# Altium footprint library Electronic Devices_LIB.PcbLib: 410 footprints (part 12 of 26)
Each footprint in its own frame and in the unit in brackets; x right, y up, seen from the top. Pads: shape width x height; smd on the part's side, far side on the other; paste and mask are expansions set on the pad; w line width, h text height; cw(c..) or ccw(c..) is an arc to the next point about the centre after c.
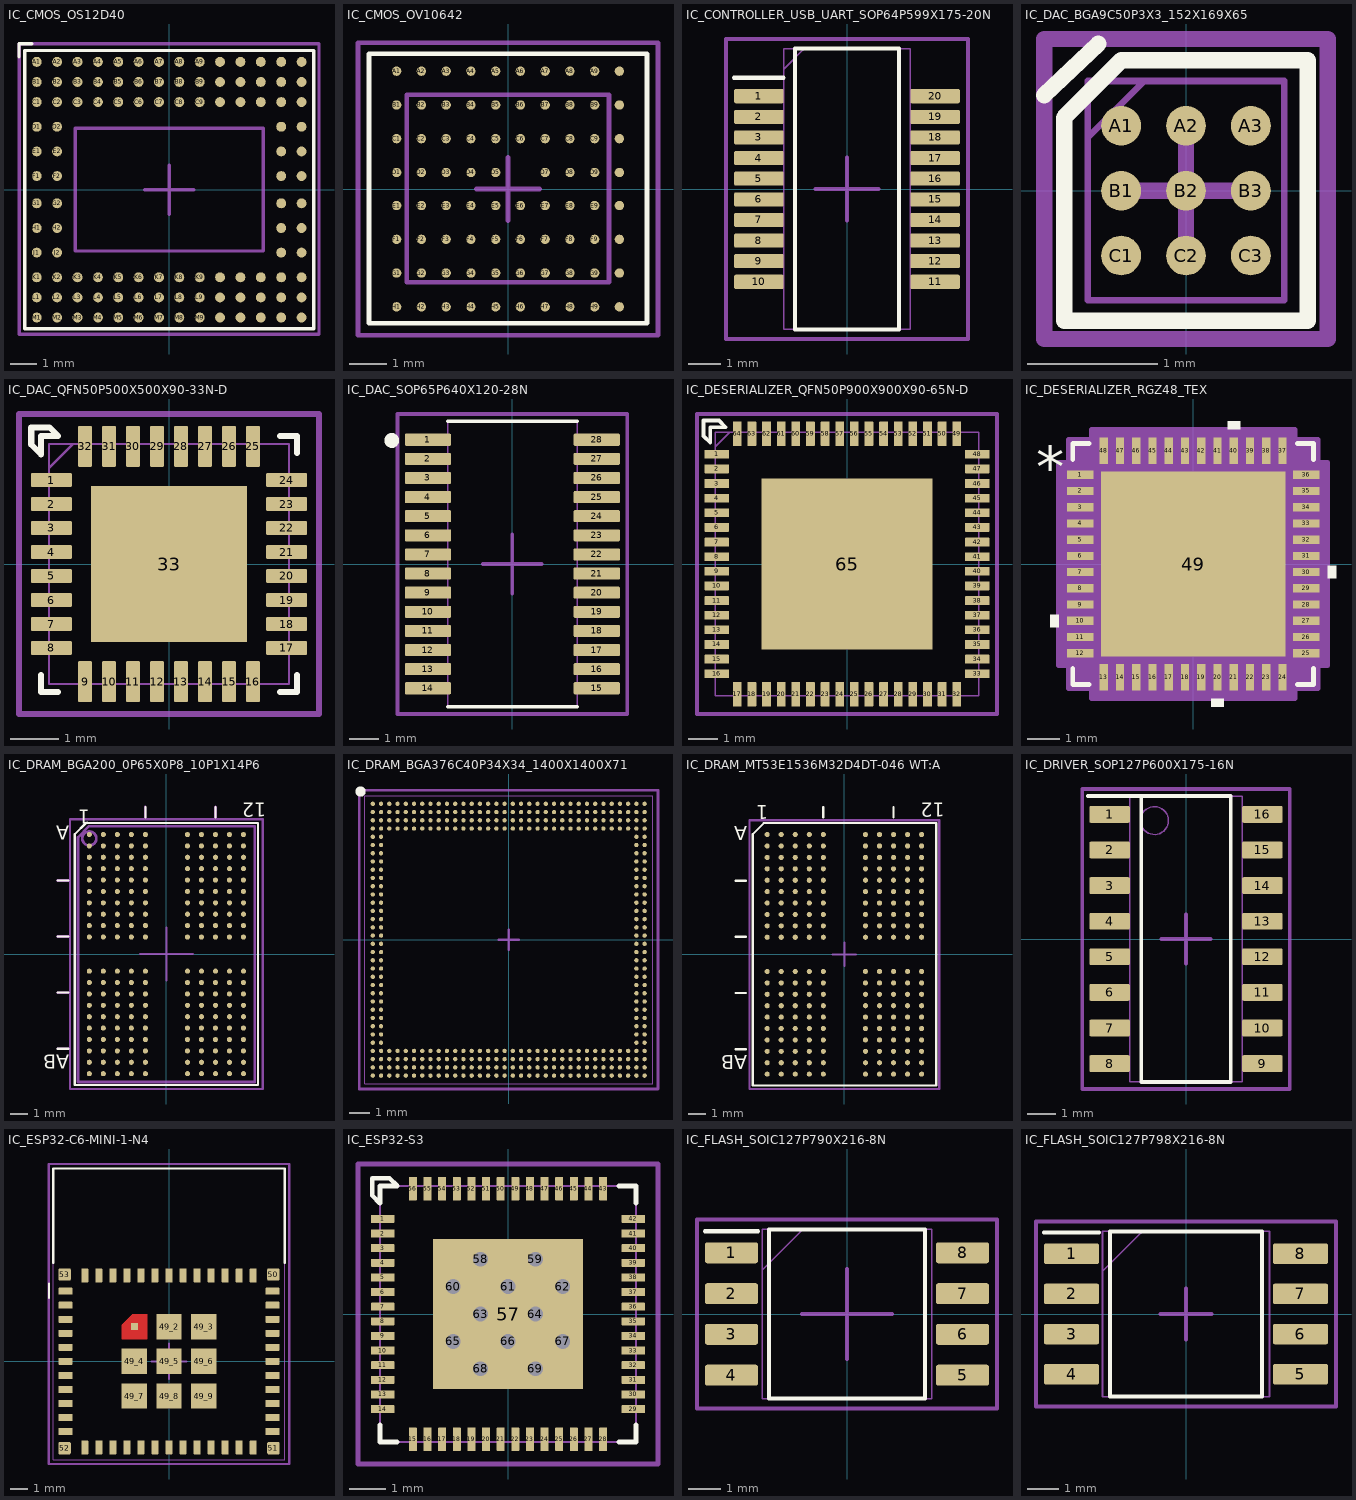
[diagram p11: the footprints below, top view; thin cyan lines are the x and y axes]

## IC_CMOS_OS12D40 [mm] "108-PIN-FANOUT BGA"
height 0.95
pads (112):
  round 0.37 smd: A1(-4.938,4.768) A2(-4.178,4.768) A3(-3.418,4.768) A4(-2.658,4.768) A5(-1.898,4.768) A6(-1.138,4.768) A7(-0.378,4.768) A8(0.378,4.768) A9(1.138,4.768) A10(1.898,4.768) A11(2.658,4.768) A12(3.418,4.768) A13(4.178,4.768) A14(4.938,4.768) B1(-4.938,4.018) B2(-4.178,4.018) B3(-3.418,4.018) B4(-2.658,4.018) B5(-1.898,4.018) B6(-1.138,4.018) B7(-0.378,4.018) B8(0.378,4.018) B9(1.138,4.018) B10(1.898,4.018) B11(2.658,4.018) B12(3.418,4.018) B13(4.178,4.018) B14(4.938,4.018) C1(-4.938,3.268) C2(-4.178,3.268) C3(-3.418,3.268) C4(-2.658,3.268) C5(-1.898,3.268) C6(-1.138,3.268) C7(-0.378,3.268) C8(0.378,3.268) C9(1.138,3.268) C10(1.898,3.268) C11(2.658,3.268) C12(3.418,3.268) C13(4.178,3.268) C14(4.938,3.268) D1(-4.938,2.348) D2(-4.178,2.348) D13(4.178,2.348) D14(4.938,2.348) E1(-4.938,1.428) E2(-4.178,1.428) E13(4.178,1.428) E14(4.938,1.428) F1(-4.938,0.508) F2(-4.178,0.508) F13(4.178,0.508) F14(4.938,0.508) G1(-4.938,-0.508) G2(-4.178,-0.508) G13(4.178,-0.508) G14(4.938,-0.508) H1(-4.938,-1.428) H2(-4.178,-1.428) H13(4.178,-1.428) H14(4.938,-1.428) J1(-4.938,-2.348) J2(-4.178,-2.348) J13(4.178,-2.348) J14(4.938,-2.348) K1(-4.938,-3.268) K2(-4.178,-3.268) K3(-3.418,-3.268) K4(-2.658,-3.268) K5(-1.898,-3.268) K6(-1.138,-3.268) K7(-0.378,-3.268) K8(0.378,-3.268) K9(1.138,-3.268) K10(1.898,-3.268) K11(2.658,-3.268) K12(3.418,-3.268) K13(4.178,-3.268) K14(4.938,-3.268) L1(-4.938,-4.018) L2(-4.178,-4.018) L3(-3.418,-4.018) L4(-2.658,-4.018) L5(-1.898,-4.018) L6(-1.138,-4.018) L7(-0.378,-4.018) L8(0.378,-4.018) L9(1.138,-4.018) L10(1.898,-4.018) L11(2.658,-4.018) L12(3.418,-4.018) L13(4.178,-4.018) L14(4.938,-4.018) M1(-4.938,-4.768) M2(-4.178,-4.768) M3(-3.418,-4.768) M4(-2.658,-4.768) M5(-1.898,-4.768) M6(-1.138,-4.768) M7(-0.378,-4.768) M8(0.378,-4.768) M9(1.138,-4.768) M10(1.898,-4.768) M11(2.658,-4.768) M12(3.418,-4.768) M13(4.178,-4.768) M14(4.938,-4.768) ""(-4.938,-4.768) ""(-4.938,4.768) ""(4.938,-4.768) ""(4.938,4.768)
Top Overlay:
  lines w0.127: -5.601,4.953 -5.601,5.436 -5.118,5.436 ; -5.385,-5.182 5.39,-5.182 5.39,5.19 -5.377,5.19 -5.385,5.182 -5.385,-5.182
Mechanical 1:
  lines w0.127: -3.505,-2.286 3.505,-2.286 3.505,2.286 3.505,2.291 -3.5,2.291 -3.505,2.286 -3.505,-2.286 ; -3.505,-2.286 -3.505,-2.286
Top Assembly:
  text ".Designator" at -2.464,-0.237 h0.51
Top Courtyard:
  lines w0.127: -0.914,0 0,0 ; 0,-0.914 0,0 ; 0,0.914 0,0 ; 0.914,0 0,0 ; -5.588,-5.385 5.588,-5.385 5.588,5.436 -5.588,5.436 -5.588,-5.385

## IC_CMOS_OV10642 [mm]
height 0.67
pads (79):
  round 0.25 smd: A1(-2.97,3.141) A2(-2.31,3.141) A3(-1.65,3.141) A4(-0.99,3.141) A5(-0.33,3.141) A6(0.33,3.141) A7(0.99,3.141) A8(1.65,3.141) A9(2.31,3.141) A10(2.97,3.141) B1(-2.97,2.241) B2(-2.31,2.241) B3(-1.65,2.241) B4(-0.99,2.241) B5(-0.33,2.241) B6(0.33,2.241) B7(0.99,2.241) B8(1.65,2.241) B9(2.31,2.241) B10(2.97,2.241) C1(-2.97,1.341) C2(-2.31,1.341) C3(-1.65,1.341) C4(-0.99,1.341) C5(-0.33,1.341) C6(0.33,1.341) C7(0.99,1.341) C8(1.65,1.341) C9(2.31,1.341) C10(2.97,1.341) D1(-2.97,0.441) D2(-2.31,0.441) D3(-1.65,0.441) D4(-0.99,0.441) D5(-0.33,0.441) D7(0.99,0.441) D8(1.65,0.441) D9(2.31,0.441) D10(2.97,0.441) E1(-2.97,-0.441) E2(-2.31,-0.441) E3(-1.65,-0.441) E4(-0.99,-0.441) E5(-0.33,-0.441) E6(0.33,-0.441) E7(0.99,-0.441) E8(1.65,-0.441) E9(2.31,-0.441) E10(2.97,-0.441) F1(-2.97,-1.341) F2(-2.31,-1.341) F3(-1.65,-1.341) F4(-0.99,-1.341) F5(-0.33,-1.341) F6(0.33,-1.341) F7(0.99,-1.341) F8(1.65,-1.341) F9(2.31,-1.341) F10(2.97,-1.341) G1(-2.97,-2.241) G2(-2.31,-2.241) G3(-1.65,-2.241) G4(-0.99,-2.241) G5(-0.33,-2.241) G6(0.33,-2.241) G7(0.99,-2.241) G8(1.65,-2.241) G9(2.31,-2.241) G10(2.97,-2.241) H1(-2.97,-3.141) H2(-2.31,-3.141) H3(-1.65,-3.141) H4(-0.99,-3.141) H5(-0.33,-3.141) H6(0.33,-3.141) H7(0.99,-3.141) H8(1.65,-3.141) H9(2.31,-3.141) H10(2.97,-3.141)
Top Overlay:
  lines w0.127: -3.71,3.581 -3.71,3.583 -3.71,-3.581 3.708,-3.581 3.708,3.581 ; -3.71,3.607 -3.023,3.607 3.708,3.607
Mechanical 1:
  lines w0.127: -2.7,-2.481 -2.692,-2.489 2.692,-2.489 2.692,2.515 -2.7,2.515 -2.7,-2.481
Top Assembly:
  text ".Designator" at -2.54,-0.263 h0.51
Top Courtyard:
  lines w0.127: -0.838,0 0,0 ; 0,-0.838 0,0 ; 0,0.838 0,0 ; 0,0 0.838,0 0,0 ; -4,-3.9 -4,3.9 4,3.9 4,-3.9 -4,-3.9

## IC_CONTROLLER_USB_UART_SOP64P599X175-20N [mm] "20-SSOP (0.154\", 3.90mm Width)"
height 1.7
pads (20):
  rrect20% 1.526x0.435 smd: 1(-2.712,2.858) 2(-2.712,2.222) 3(-2.712,1.588) 4(-2.712,0.952) 5(-2.712,0.318) 6(-2.712,-0.318) 7(-2.712,-0.952) 8(-2.712,-1.588) 9(-2.712,-2.222) 10(-2.712,-2.858) 11(2.712,-2.858) 12(2.712,-2.222) 13(2.712,-1.588) 14(2.712,-0.952) 15(2.712,-0.318) 16(2.712,0.318) 17(2.712,0.952) 18(2.712,1.588) 19(2.712,2.222) 20(2.712,2.858)
Top Overlay:
  lines w0.127: -3.475,3.425 -1.95,3.425 ; -1.6,-4.324 1.6,-4.324 1.6,4.324 -1.6,4.324 -1.6,-4.324
Top Assembly:
  text ".Designator" at -2.616,-0.161 h0.51
Top Courtyard:
  lines w0.127: -0.965,0 0,0 ; 0,-0.965 0,0 ; 0,0.965 0,0 ; 0.965,0 0,0 ; -3.725,-4.619 3.725,-4.619 3.725,4.619 -3.725,4.619 -3.725,-4.619
Top Component Center:
  lines w0.051: -1.95,3.69 -1.314,4.324 ; -1.95,-4.324 1.95,-4.324 1.95,4.324 -1.95,4.324 -1.95,-4.324
3D body "FT231XS-R.stp": height 1.75, standoff 0, extent -2.997,-4.324 2.997,4.324

## IC_DAC_BGA9C50P3X3_152X169X65 [mm]
pads (9):
  round 0.306 smd: A1(-0.5,0.5) A2(0,0.5) A3(0.5,0.5) B1(-0.5,0) B2(0,0) B3(0.5,0) C1(-0.5,-0.5) C2(0,-0.5) C3(0.5,-0.5)
Top Overlay:
  lines w0.127: -1.092,0.737 -0.678,1.13 ; -0.94,-1.003 -0.94,0.563 -0.5,1.003 0.94,1.003 0.94,-1.003 -0.94,-1.003
Top Assembly:
  lines w0.051: -0.758,0.408 -0.32,0.846 ; -0.758,-0.845 -0.758,0.845 0.757,0.845 0.757,-0.845 -0.758,-0.845
  text ".Designator" at -2.54,-0.263 h0.51
Top Courtyard:
  lines w0.127: -0.432,0 0,0 ; 0,-0.432 0,0 ; 0,0.432 0,0 ; 0.432,0 0,0 ; -1.092,-1.143 -1.092,1.168 1.092,1.168 1.092,-1.143 -1.092,-1.143
3D body "AD5821ABCBZ-REEL7.stp": height 0.65, standoff 0, extent -0.757,-0.845 0.757,0.845

## IC_DAC_QFN50P500X500X90-33N-D [mm] "32 QFN"
height 0.8
pads (33):
  rrect20% 0.85x0.3 smd: 1(-2.45,1.75) 2(-2.45,1.25) 3(-2.45,0.75) 4(-2.45,0.25) 5(-2.45,-0.25) 6(-2.45,-0.75) 7(-2.45,-1.25) 8(-2.45,-1.75) 17(2.45,-1.75) 18(2.45,-1.25) 19(2.45,-0.75) 20(2.45,-0.25) 21(2.45,0.25) 22(2.45,0.75) 23(2.45,1.25) 24(2.45,1.75)
  rrect20% 0.3x0.85 smd: 9(-1.75,-2.45) 10(-1.25,-2.45) 11(-0.75,-2.45) 12(-0.25,-2.45) 13(0.25,-2.45) 14(0.75,-2.45) 15(1.25,-2.45) 16(1.75,-2.45) 25(1.75,2.45) 26(1.25,2.45) 27(0.75,2.45) 28(0.25,2.45) 29(-0.25,2.45) 30(-0.75,2.45) 31(-1.25,2.45) 32(-1.75,2.45)
  rect 3.25x3.25 smd: 33(0,0)
Top Overlay:
  lines w0.127: -2.667,-2.311 -2.667,-2.667 -2.311,-2.667 ; 2.311,-2.667 2.667,-2.667 2.667,-2.311 ; 2.311,2.667 2.667,2.667 2.667,2.311 ; -2.87,2.489 -2.667,2.286 -2.667,2.667 -2.311,2.667 -2.489,2.845 -2.515,2.845 -2.87,2.845 -2.87,2.489
Top Assembly:
  lines w0.051: -2.5,2 -2,2.5 ; -2.5,-2.5 2.5,-2.5 2.5,2.5 -2.5,2.5 -2.5,-2.5
  text ".Designator" at -2.489,-0.085 h0.51
Top Courtyard:
  lines w0.127: -0.635,0 0,0 ; 0,-0.635 0,0 ; 0,0.635 0,0 ; 0.635,0 0,0 ; -3.125,-3.125 3.125,-3.125 3.125,3.125 -3.125,3.125 -3.125,-3.125
3D body "ES9039Q2M.stp": height 0.9, standoff 0, extent -2.55,-2.55 2.55,2.55

## IC_DAC_SOP65P640X120-28N [mm]
pads (28):
  rrect20% 1.57x0.41 smd: 1(-2.87,4.225) 2(-2.87,3.575) 3(-2.87,2.925) 4(-2.87,2.275) 5(-2.87,1.625) 6(-2.87,0.975) 7(-2.87,0.325) 8(-2.87,-0.325) 9(-2.87,-0.975) 10(-2.87,-1.625) 11(-2.87,-2.275) 12(-2.87,-2.925) 13(-2.87,-3.575) 14(-2.87,-4.225) 15(2.87,-4.225) 16(2.87,-3.575) 17(2.87,-2.925) 18(2.87,-2.275) 19(2.87,-1.625) 20(2.87,-0.975) 21(2.87,-0.325) 22(2.87,0.325) 23(2.87,0.975) 24(2.87,1.625) 25(2.87,2.275) 26(2.87,2.925) 27(2.87,3.575) 28(2.87,4.225)
Top Overlay:
  circle w0.3: c-4.1,4.2 r0.1
  lines w0.127: -2.2,-4.85 2.2,-4.85 ; -2.2,4.85 2.2,4.85
Top Assembly:
  lines w0.051: -2.2,-4.85 -2.2,4.85 2.2,4.85 2.2,-4.85 -2.2,-4.85
  text ".Designator" at -2.549,-0.28 h0.51
Top Courtyard:
  lines w0.127: -1,0 0,0 ; 0,-1 0,0 ; 0,1 0,0 ; 1,0 0,0 ; -3.905,-5.1 3.905,-5.1 3.905,5.1 -3.905,5.1 -3.905,-5.1
3D body "step_temp.STEP": height 1.2, standoff 0, extent -3.2,-4.85 3.2,4.85

## IC_DESERIALIZER_QFN50P900X900X90-65N-D [mm]
pads (65):
  rrect20% 0.85x0.3 smd: 1(-4.45,3.75) 2(-4.45,3.25) 3(-4.45,2.75) 4(-4.45,2.25) 5(-4.45,1.75) 6(-4.45,1.25) 7(-4.45,0.75) 8(-4.45,0.25) 9(-4.45,-0.25) 10(-4.45,-0.75) 11(-4.45,-1.25) 12(-4.45,-1.75) 13(-4.45,-2.25) 14(-4.45,-2.75) 15(-4.45,-3.25) 16(-4.45,-3.75) 33(4.45,-3.75) 34(4.45,-3.25) 35(4.45,-2.75) 36(4.45,-2.25) 37(4.45,-1.75) 38(4.45,-1.25) 39(4.45,-0.75) 40(4.45,-0.25) 41(4.45,0.25) 42(4.45,0.75) 43(4.45,1.25) 44(4.45,1.75) 45(4.45,2.25) 46(4.45,2.75) 47(4.45,3.25) 48(4.45,3.75)
  rrect20% 0.3x0.85 smd: 17(-3.75,-4.45) 18(-3.25,-4.45) 19(-2.75,-4.45) 20(-2.25,-4.45) 21(-1.75,-4.45) 22(-1.25,-4.45) 23(-0.75,-4.45) 24(-0.25,-4.45) 25(0.25,-4.45) 26(0.75,-4.45) 27(1.25,-4.45) 28(1.75,-4.45) 29(2.25,-4.45) 30(2.75,-4.45) 31(3.25,-4.45) 32(3.75,-4.45) 49(3.75,4.45) 50(3.25,4.45) 51(2.75,4.45) 52(2.25,4.45) 53(1.75,4.45) 54(1.25,4.45) 55(0.75,4.45) 56(0.25,4.45) 57(-0.25,4.45) 58(-0.75,4.45) 59(-1.25,4.45) 60(-1.75,4.45) 61(-2.25,4.45) 62(-2.75,4.45) 63(-3.25,4.45) 64(-3.75,4.45)
  rect 5.85x5.85 smd: 65(0,0)
Top Overlay:
  lines w0.127: -4.902,4.369 -4.674,4.14 -4.674,4.674 -4.14,4.674 -4.369,4.902 -4.902,4.902 -4.902,4.369
Top Assembly:
  lines w0.051: -4.5,4 -4,4.5 ; -4.5,-4.5 4.5,-4.5 4.5,4.5 -4.5,4.5 -4.5,-4.5
Top Courtyard:
  lines w0.127: -5.125,-5.125 5.125,-5.125 5.125,5.125 -5.125,5.125 -5.125,-5.125
3D body "DS90UB960WRTDRQ1.stp": height 0.85, standoff 0, extent -4.5,-4.5 4.5,4.5

## IC_DESERIALIZER_RGZ48_TEX [mil]
pads (49):
  rect 32x10 smd paste+0 mask+0: 1(-137,108.27) 2(-137,88.58) 3(-137,68.9) 4(-137,49.21) 5(-137,29.53) 6(-137,9.84) 7(-137,-9.84) 8(-137,-29.53) 9(-137,-49.21) 10(-137,-68.9) 11(-137,-88.58) 12(-137,-108.27) 25(137,-108.27) 26(137,-88.58) 27(137,-68.9) 28(137,-49.21) 29(137,-29.53) 30(137,-9.84) 31(137,9.84) 32(137,29.53) 33(137,49.21) 34(137,68.9) 35(137,88.58) 36(137,108.27)
  rect 10x32 smd paste+0 mask+0: 13(-108.27,-137) 14(-88.58,-137) 15(-68.9,-137) 16(-49.21,-137) 17(-29.53,-137) 18(-9.84,-137) 19(9.84,-137) 20(29.53,-137) 21(49.21,-137) 22(68.9,-137) 23(88.58,-137) 24(108.27,-137) 37(108.27,137) 38(88.58,137) 39(68.9,137) 40(49.21,137) 41(29.53,137) 42(9.84,137) 43(-9.84,137) 44(-29.53,137) 45(-49.21,137) 46(-68.9,137) 47(-88.58,137) 48(-108.27,137)
  rect 224x224 smd paste-111.5 mask-111.5: 49(0,0)
Top Overlay:
  region: 56.71,163 41.71,163 41.71,173 56.71,173
  region: 163,-2.34 173,-2.34 173,-17.34 163,-17.34
  region: 37.03,-163 22.03,-163 22.03,-173 37.03,-173
  region: -163,-61.4 -173,-61.4 -173,-76.4 -163,-76.4
  lines w6: -146,-126.37 -146,-146 -126.37,-146 ; -146,126.37 -146,146 -126.37,146 ; 126.37,-146 146,-146 146,-126.37 ; 126.37,146 146,146 146,126.37
  text "*" at -190.5,93.11 h50
Top Paste:
  drawing of 64 lines, arcs and shapes, not listed
Top Solder:
  region: 100.87,-114.5 100.87,114.5 114.5,114.5 114.5,-114.5
  region: 85.13,-114.5 85.13,114.5 69.87,114.5 69.87,-114.5
  region: 54.13,-114.5 54.13,114.5 38.87,114.5 38.87,-114.5
  region: 23.13,-114.5 23.13,114.5 7.87,114.5 7.87,-114.5
  region: -7.87,-114.5 -7.87,114.5 -23.13,114.5 -23.13,-114.5
  region: -38.87,-114.5 -38.87,114.5 -54.13,114.5 -54.13,-114.5
  region: -69.87,-114.5 -69.87,114.5 -85.13,114.5 -85.13,-114.5
  region: -114.5,-114.5 -114.5,114.5 -100.87,114.5 -100.87,-114.5
  region: -114.5,-114.5 -114.5,-100.87 114.5,-100.87 114.5,-114.5
  region: -114.5,-85.13 -114.5,-69.87 114.5,-69.87 114.5,-85.13
  region: -114.5,-54.13 -114.5,-38.87 114.5,-38.87 114.5,-54.13
  region: -114.5,-23.13 -114.5,-7.87 114.5,-7.87 114.5,-23.13
  region: -114.5,7.87 -114.5,23.13 114.5,23.13 114.5,7.87
  region: -114.5,38.87 -114.5,54.13 114.5,54.13 114.5,38.87
  region: -114.5,69.87 -114.5,85.13 114.5,85.13 114.5,69.87
  region: -114.5,100.87 -114.5,114.5 114.5,114.5 114.5,100.87
Top 3D Body:
  lines w1: -141,91 -91,141 ; -141,-141 -141,141 141,141 141,-141 -141,-141 ; -141,-114.27 -141,-102.27 -141,-114.27 ; -141,-94.58 -141,-82.58 -141,-94.58 ; -141,-74.9 -141,-62.9 -141,-74.9 ; -141,-55.21 -141,-43.21 -141,-55.21 ; -141,-35.53 -141,-23.53 -141,-35.53 ; -141,-15.84 -141,-3.84 -141,-15.84 ; -141,3.84 -141,15.84 -141,3.84 ; -141,23.53 -141,35.53 -141,23.53 ; -141,43.21 -141,55.21 -141,43.21 ; -141,62.9 -141,74.9 -141,62.9 ; -141,82.58 -141,94.58 -141,82.58 ; -141,102.27 -141,114.27 -141,102.27 ; -114.27,-141 -102.27,-141 -114.27,-141 ; -114.27,141 -102.27,141 -114.27,141 ; -94.58,-141 -82.58,-141 -94.58,-141 ; -94.58,141 -82.58,141 -94.58,141 ; -74.9,-141 -62.9,-141 -74.9,-141 ; -74.9,141 -62.9,141 -74.9,141 ; -55.21,-141 -43.21,-141 -55.21,-141 ; -55.21,141 -43.21,141 -55.21,141 ; -35.53,-141 -23.53,-141 -35.53,-141 ; -35.53,141 -23.53,141 -35.53,141 ; -15.84,-141 -3.84,-141 -15.84,-141 ; -15.84,141 -3.84,141 -15.84,141 ; 3.84,-141 15.84,-141 3.84,-141 ; 3.84,141 15.84,141 3.84,141 ; 23.53,-141 35.53,-141 23.53,-141 ; 23.53,141 35.53,141 23.53,141 ; 43.21,-141 55.21,-141 43.21,-141 ; 43.21,141 55.21,141 43.21,141 ; 62.9,-141 74.9,-141 62.9,-141 ; 62.9,141 74.9,141 62.9,141 ; 82.58,-141 94.58,-141 82.58,-141 ; 82.58,141 94.58,141 82.58,141 ; 102.27,-141 114.27,-141 102.27,-141 ; 102.27,141 114.27,141 102.27,141 ; 141,-114.27 141,-102.27 141,-114.27 ; 141,-94.58 141,-82.58 141,-94.58 ; 141,-74.9 141,-62.9 141,-74.9 ; 141,-55.21 141,-43.21 141,-55.21 ; 141,-35.53 141,-23.53 141,-35.53 ; 141,-15.84 141,-3.84 141,-15.84 ; 141,3.84 141,15.84 141,3.84 ; 141,23.53 141,35.53 141,23.53 ; 141,43.21 141,55.21 141,43.21 ; 141,62.9 141,74.9 141,62.9 ; 141,82.58 141,94.58 141,82.58 ; 141,102.27 141,114.27 141,102.27
  text "*" at -133.5,93.11 h50
Mechanical 15:
  region: -123.27,-151 -151,-151 -151,-123.27 -163,-123.27 -163,123.27 -151,123.27 -151,151 -123.27,151 -123.27,163 123.27,163 123.27,151 151,151 151,123.27 163,123.27 163,-123.27 151,-123.27 151,-151 123.27,-151 123.27,-163 -123.27,-163
  lines w6: -163,-123.27 -163,123.27 -151,123.27 -151,151 -123.27,151 -123.27,163 123.27,163 123.27,151 151,151 151,123.27 163,123.27 163,-123.27 151,-123.27 151,-151 123.27,-151 123.27,-163 -123.27,-163 -123.27,-151 -151,-151 -151,-123.27 -163,-123.27
3D body "RGZ48_TEX.step": height 39.09, standoff 0, extent -140.98,-140.98 140.98,140.98

## IC_DRAM_BGA200_0P65X0P8_10P1X14P6 [mil] "200-TFBGA (10x14.5)"
height 37.4
pads (200):
  round 11.5 smd: A1(-173.23,268.7) A2(-141.73,268.7) A3(-110.24,268.7) A4(-78.74,268.7) A5(-47.24,268.7) A8(47.24,268.7) A9(78.74,268.7) A10(110.24,268.7) A11(141.73,268.7) A12(173.23,268.7) AA1(-173.23,-243.11) AA2(-141.73,-243.11) AA3(-110.24,-243.11) AA4(-78.74,-243.11) AA5(-47.24,-243.11) AA8(47.24,-243.11) AA9(78.74,-243.11) AA10(110.24,-243.11) AA11(141.73,-243.11) AA12(173.23,-243.11) AB1(-173.23,-268.7) AB2(-141.73,-268.7) AB3(-110.24,-268.7) AB4(-78.74,-268.7) AB5(-47.24,-268.7) AB8(47.24,-268.7) AB9(78.74,-268.7) AB10(110.24,-268.7) AB11(141.73,-268.7) AB12(173.23,-268.7) B1(-173.23,243.11) B2(-141.73,243.11) B3(-110.24,243.11) B4(-78.74,243.11) B5(-47.24,243.11) B8(47.24,243.11) B9(78.74,243.11) B10(110.24,243.11) B11(141.73,243.11) B12(173.23,243.11) C1(-173.23,217.52) C2(-141.73,217.52) C3(-110.24,217.52) C4(-78.74,217.52) C5(-47.24,217.52) C8(47.24,217.52) C9(78.74,217.52) C10(110.24,217.52) C11(141.73,217.52) C12(173.23,217.52) D1(-173.23,191.93) D2(-141.73,191.93) D3(-110.24,191.93) D4(-78.74,191.93) D5(-47.24,191.93) D8(47.24,191.93) D9(78.74,191.93) D10(110.24,191.93) D11(141.73,191.93) D12(173.23,191.93) E1(-173.23,166.34) E2(-141.73,166.34) E3(-110.24,166.34) E4(-78.74,166.34) E5(-47.24,166.34) E8(47.24,166.34) E9(78.74,166.34) E10(110.24,166.34) E11(141.73,166.34) E12(173.23,166.34) F1(-173.23,140.75) F2(-141.73,140.75) F3(-110.24,140.75) F4(-78.74,140.75) F5(-47.24,140.75) F8(47.24,140.75) F9(78.74,140.75) F10(110.24,140.75) F11(141.73,140.75) F12(173.23,140.75) G1(-173.23,115.16) G2(-141.73,115.16) G3(-110.24,115.16) G4(-78.74,115.16) G5(-47.24,115.16) G8(47.24,115.16) G9(78.74,115.16) G10(110.24,115.16) G11(141.73,115.16) G12(173.23,115.16) H1(-173.23,89.57) H2(-141.73,89.57) H3(-110.24,89.57) H4(-78.74,89.57) H5(-47.24,89.57) H8(47.24,89.57) H9(78.74,89.57) H10(110.24,89.57) H11(141.73,89.57) H12(173.23,89.57) J1(-173.23,63.98) J2(-141.73,63.98) J3(-110.24,63.98) J4(-78.74,63.98) J5(-47.24,63.98) J8(47.24,63.98) J9(78.74,63.98) J10(110.24,63.98) J11(141.73,63.98) J12(173.23,63.98) K1(-173.23,38.39) K2(-141.73,38.39) K3(-110.24,38.39) K4(-78.74,38.39) K5(-47.24,38.39) K8(47.24,38.39) K9(78.74,38.39) K10(110.24,38.39) K11(141.73,38.39) K12(173.23,38.39) N1(-173.23,-38.39) N2(-141.73,-38.39) N3(-110.24,-38.39) N4(-78.74,-38.39) N5(-47.24,-38.39) N8(47.24,-38.39) N9(78.74,-38.39) N10(110.24,-38.39) N11(141.73,-38.39) N12(173.23,-38.39) P1(-173.23,-63.98) P2(-141.73,-63.98) P3(-110.24,-63.98) P4(-78.74,-63.98) P5(-47.24,-63.98) P8(47.24,-63.98) P9(78.74,-63.98) P10(110.24,-63.98) P11(141.73,-63.98) P12(173.23,-63.98) R1(-173.23,-89.57) R2(-141.73,-89.57) R3(-110.24,-89.57) R4(-78.74,-89.57) R5(-47.24,-89.57) R8(47.24,-89.57) R9(78.74,-89.57) R10(110.24,-89.57) R11(141.73,-89.57) R12(173.23,-89.57) T1(-173.23,-115.16) T2(-141.73,-115.16) T3(-110.24,-115.16) T4(-78.74,-115.16) T5(-47.24,-115.16) T8(47.24,-115.16) T9(78.74,-115.16) T10(110.24,-115.16) T11(141.73,-115.16) T12(173.23,-115.16) U1(-173.23,-140.75) U2(-141.73,-140.75) U3(-110.24,-140.75) U4(-78.74,-140.75) U5(-47.24,-140.75) U8(47.24,-140.75) U9(78.74,-140.75) U10(110.24,-140.75) U11(141.73,-140.75) U12(173.23,-140.75) V1(-173.23,-166.34) V2(-141.73,-166.34) V3(-110.24,-166.34) V4(-78.74,-166.34) V5(-47.24,-166.34) V8(47.24,-166.34) V9(78.74,-166.34) V10(110.24,-166.34) V11(141.73,-166.34) V12(173.23,-166.34) W1(-173.23,-191.93) W2(-141.73,-191.93) W3(-110.24,-191.93) W4(-78.74,-191.93) W5(-47.24,-191.93) W8(47.24,-191.93) W9(78.74,-191.93) W10(110.24,-191.93) W11(141.73,-191.93) W12(173.23,-191.93) Y1(-173.23,-217.52) Y2(-141.73,-217.52) Y3(-110.24,-217.52) Y4(-78.74,-217.52) Y5(-47.24,-217.52) Y8(47.24,-217.52) Y9(78.74,-217.52) Y10(110.24,-217.52) Y11(141.73,-217.52) Y12(173.23,-217.52)
Top Overlay:
  lines w5: -244.09,-212.6 -220.47,-212.6 ; -244.09,-86.61 -220.47,-86.61 ; -244.09,39.37 -220.47,39.37 ; -244.09,165.35 -220.47,165.35 ; -47.24,307.09 -47.24,330.71 ; 110.24,307.09 110.24,330.71 ; -205.82,-294.4 -205.82,269.4 -180.82,294.4 205.82,294.4 205.82,-294.4 -205.82,-294.4
  text "12" at 224.76,339.97 h31
  text "1" at -170.96,324.55 h31
  text "A" at -218.24,287.97 h31
  text "AB" at -218.24,-226.03 h31
Top Assembly:
  circle w6: c-173.23,259.84 r15.75
  lines w6: -244.09,-212.6 -220.47,-212.6 ; -244.09,-86.61 -220.47,-86.61 ; -244.09,39.37 -220.47,39.37 ; -244.09,165.35 -220.47,165.35 ; -47.24,307.09 -47.24,330.71 ; 110.24,307.09 110.24,330.71 ; -198.82,-287.4 -198.82,262.4 -173.82,287.4 198.82,287.4 198.82,-287.4 -198.82,-287.4
  text ".Designator" at -88.55,-11.02 h20
  text "AB" at -214.73,-279.27 h20
  text "A" at -236.22,259.84 h20
  text "12" at 173.23,307.09 h20
  text "1" at -173.23,307.09 h20
Top Courtyard:
  lines w5: -59.06,0 0,0 ; 0,-59.06 0,0 ; 0,59.06 0,0 ; 59.06,0 0,0 ; -216.54,-303.15 -216.54,303.15 216.54,303.15 216.54,-303.15 -216.54,-303.15
Top Component Center:
  lines w1: -10,0 10,0 ; 0,-10 0,10
3D body "VFBGA200_10X145_DT_MRN.step": height 37.09, standoff -0.01, extent -199.02,-292.48 199.02,282.48

## IC_DRAM_BGA376C40P34X34_1400X1400X71 [mm] "BGA, 376-Leads, Body 14.00x14.00mmx0.71mm, Pitch 0.40mm"
height 0.71
pads (376):
  round 0.21 smd: A2(-6.2,6.6) A3(-5.8,6.6) A4(-5.4,6.6) A5(-5,6.6) A6(-4.6,6.6) A7(-4.2,6.6) A10(-3,6.6) A11(-2.6,6.6) A12(-2.2,6.6) A13(-1.8,6.6) A14(-1.4,6.6) A15(-1,6.6) A16(-0.6,6.6) A19(0.6,6.6) A20(1,6.6) A21(1.4,6.6) A22(1.8,6.6) A23(2.2,6.6) A24(2.6,6.6) A25(3,6.6) A26(3.4,6.6) A29(4.6,6.6) A30(5,6.6) A31(5.4,6.6) A32(5.8,6.6) A33(6.2,6.6) AH1(-6.6,-4.2) AH2(-6.2,-4.2) AH33(6.2,-4.2) AH34(6.6,-4.2) AJ1(-6.6,-4.6) AJ2(-6.2,-4.6) AJ33(6.2,-4.6) AJ34(6.6,-4.6) AK1(-6.6,-5) AK2(-6.2,-5) AK33(6.2,-5) AK34(6.6,-5) AL1(-6.6,-5.4) AL2(-6.2,-5.4) AL3(-5.8,-5.4) AL4(-5.4,-5.4) AL5(-5,-5.4) AL6(-4.6,-5.4) AL7(-4.2,-5.4) AL8(-3.8,-5.4) AL9(-3.4,-5.4) AL10(-3,-5.4) AL11(-2.6,-5.4) AL12(-2.2,-5.4) AL13(-1.8,-5.4) AL14(-1.4,-5.4) AL15(-1,-5.4) AL16(-0.6,-5.4) AL17(-0.2,-5.4) AL18(0.2,-5.4) AL19(0.6,-5.4) AL20(1,-5.4) AL21(1.4,-5.4) AL22(1.8,-5.4) AL23(2.2,-5.4) AL24(2.6,-5.4) AL25(3,-5.4) AL26(3.4,-5.4) AL27(3.8,-5.4) AL28(4.2,-5.4) AL29(4.6,-5.4) AL30(5,-5.4) AL31(5.4,-5.4) AL32(5.8,-5.4) AL33(6.2,-5.4) AL34(6.6,-5.4) AM1(-6.6,-5.8) AM2(-6.2,-5.8) AM3(-5.8,-5.8) AM4(-5.4,-5.8) AM5(-5,-5.8) AM6(-4.6,-5.8) AM7(-4.2,-5.8) AM8(-3.8,-5.8) AM9(-3.4,-5.8) AM10(-3,-5.8) AM11(-2.6,-5.8) AM12(-2.2,-5.8) AM13(-1.8,-5.8) AM14(-1.4,-5.8) AM15(-1,-5.8) AM16(-0.6,-5.8) AM17(-0.2,-5.8) AM18(0.2,-5.8) AM19(0.6,-5.8) AM20(1,-5.8) AM21(1.4,-5.8) AM22(1.8,-5.8) AM23(2.2,-5.8) AM24(2.6,-5.8) AM25(3,-5.8) AM26(3.4,-5.8) AM27(3.8,-5.8) AM28(4.2,-5.8) AM29(4.6,-5.8) AM30(5,-5.8) AM31(5.4,-5.8) AM32(5.8,-5.8) AM33(6.2,-5.8) AM34(6.6,-5.8) AN1(-6.6,-6.2) AN2(-6.2,-6.2) AN3(-5.8,-6.2) AN4(-5.4,-6.2) AN5(-5,-6.2) AN6(-4.6,-6.2) AN7(-4.2,-6.2) AN8(-3.8,-6.2) AN9(-3.4,-6.2) AN10(-3,-6.2) AN11(-2.6,-6.2) AN12(-2.2,-6.2) AN13(-1.8,-6.2) AN14(-1.4,-6.2) AN15(-1,-6.2) AN16(-0.6,-6.2) AN19(0.6,-6.2) AN20(1,-6.2) AN21(1.4,-6.2) AN22(1.8,-6.2) AN23(2.2,-6.2) AN24(2.6,-6.2) AN25(3,-6.2) AN26(3.4,-6.2) AN27(3.8,-6.2) AN28(4.2,-6.2) AN29(4.6,-6.2) AN30(5,-6.2) AN31(5.4,-6.2) AN32(5.8,-6.2) AN33(6.2,-6.2) AN34(6.6,-6.2) AP2(-6.2,-6.6) AP3(-5.8,-6.6) AP4(-5.4,-6.6) AP5(-5,-6.6) AP6(-4.6,-6.6) AP7(-4.2,-6.6) AP10(-3,-6.6) AP11(-2.6,-6.6) AP12(-2.2,-6.6) AP13(-1.8,-6.6) AP14(-1.4,-6.6) AP15(-1,-6.6) AP16(-0.6,-6.6) AP19(0.6,-6.6) AP20(1,-6.6) AP21(1.4,-6.6) AP22(1.8,-6.6) AP23(2.2,-6.6) AP24(2.6,-6.6) AP25(3,-6.6) AP28(4.2,-6.6) AP29(4.6,-6.6) AP30(5,-6.6) AP31(5.4,-6.6) AP32(5.8,-6.6) AP33(6.2,-6.6) B1(-6.6,6.2) B2(-6.2,6.2) B3(-5.8,6.2) B4(-5.4,6.2) B5(-5,6.2) B6(-4.6,6.2) B7(-4.2,6.2) B8(-3.8,6.2) B9(-3.4,6.2) B10(-3,6.2) B11(-2.6,6.2) B12(-2.2,6.2) B13(-1.8,6.2) B14(-1.4,6.2) B15(-1,6.2) B16(-0.6,6.2) B17(-0.2,6.2) B18(0.2,6.2) B19(0.6,6.2) B20(1,6.2) B21(1.4,6.2) B22(1.8,6.2) B23(2.2,6.2) B24(2.6,6.2) B25(3,6.2) B26(3.4,6.2) B27(3.8,6.2) B28(4.2,6.2) B29(4.6,6.2) B30(5,6.2) B31(5.4,6.2) B32(5.8,6.2) B33(6.2,6.2) B34(6.6,6.2) C1(-6.6,5.8) C2(-6.2,5.8) C3(-5.8,5.8) C4(-5.4,5.8) C5(-5,5.8) C6(-4.6,5.8) C7(-4.2,5.8) C8(-3.8,5.8) C9(-3.4,5.8) C10(-3,5.8) C11(-2.6,5.8) C12(-2.2,5.8) C13(-1.8,5.8) C14(-1.4,5.8) C15(-1,5.8) C16(-0.6,5.8) C17(-0.2,5.8) C19(0.6,5.8) C20(1,5.8) C21(1.4,5.8) C22(1.8,5.8) C23(2.2,5.8) C24(2.6,5.8) C25(3,5.8) C26(3.4,5.8) C27(3.8,5.8) C28(4.2,5.8) C29(4.6,5.8) C30(5,5.8) C31(5.4,5.8) C32(5.8,5.8) C33(6.2,5.8) C34(6.6,5.8) D1(-6.6,5.4) D2(-6.2,5.4) D3(-5.8,5.4) D4(-5.4,5.4) D5(-5,5.4) D6(-4.6,5.4) D7(-4.2,5.4) D8(-3.8,5.4) D9(-3.4,5.4) D10(-3,5.4) D11(-2.6,5.4) D12(-2.2,5.4) D13(-1.8,5.4) D14(-1.4,5.4) D15(-1,5.4) D16(-0.6,5.4) D17(-0.2,5.4) D18(0.2,5.4) D19(0.6,5.4) D20(1,5.4) D21(1.4,5.4) D22(1.8,5.4) D23(2.2,5.4) D24(2.6,5.4) D25(3,5.4) D26(3.4,5.4) D27(3.8,5.4) D28(4.2,5.4) D29(4.6,5.4) D30(5,5.4) D31(5.4,5.4) D32(5.8,5.4) D33(6.2,5.4) D34(6.6,5.4) E1(-6.6,5) E2(-6.2,5) E33(6.2,5) E34(6.6,5) F1(-6.6,4.6) F2(-6.2,4.6) F33(6.2,4.6) F34(6.6,4.6) G1(-6.6,4.2) G2(-6.2,4.2) G33(6.2,4.2) G34(6.6,4.2) H1(-6.6,3.8) H2(-6.2,3.8) NC(-6.6,-6.6) NC(-6.6,-3.8) NC(-6.6,-3.4) NC(-6.6,-3) NC(-6.6,-2.6) NC(-6.6,-2.2) NC(-6.6,-1.8) NC(-6.6,-1.4) NC(-6.6,-1) NC(-6.6,-0.6) NC(-6.6,-0.2) NC(-6.6,0.2) NC(-6.6,0.6) NC(-6.6,1) NC(-6.6,1.4) NC(-6.6,1.8) NC(-6.6,2.2) NC(-6.6,2.6) NC(-6.6,3) NC(-6.6,3.4) NC(-6.6,6.6) NC(-6.2,-3.8) NC(-6.2,-3.4) NC(-6.2,-3) NC(-6.2,-2.6) NC(-6.2,-2.2) NC(-6.2,-1.8) NC(-6.2,-1.4) NC(-6.2,-1) NC(-6.2,-0.6) NC(-6.2,-0.2) NC(-6.2,0.2) NC(-6.2,0.6) NC(-6.2,1) NC(-6.2,1.4) NC(-6.2,1.8) NC(-6.2,2.2) NC(-6.2,2.6) NC(-6.2,3) NC(-6.2,3.4) NC(-3.8,-6.6) NC(-3.8,6.6) NC(-3.4,-6.6) NC(-3.4,6.6) NC(-0.2,-6.6) NC(-0.2,-6.2) NC(-0.2,6.6) NC(0.2,-6.6) NC(0.2,-6.2) NC(0.2,5.8) NC(0.2,6.6) NC(3.4,-6.6) NC(3.8,-6.6) NC(3.8,6.6) NC(4.2,6.6) NC(6.2,-3.8) NC(6.2,-3.4) NC(6.2,-3) NC(6.2,-2.6) NC(6.2,-2.2) NC(6.2,-1.8) NC(6.2,-1.4) NC(6.2,-1) NC(6.2,-0.6) NC(6.2,-0.2) NC(6.2,0.2) NC(6.2,0.6) NC(6.2,1) NC(6.2,1.4) NC(6.2,1.8) NC(6.2,2.2) NC(6.2,2.6) NC(6.2,3) NC(6.2,3.4) NC(6.2,3.8) NC(6.6,-6.6) NC(6.6,-3.8) NC(6.6,-3.4) NC(6.6,-3) NC(6.6,-2.6) NC(6.6,-2.2) NC(6.6,-1.8) NC(6.6,-1.4) NC(6.6,-1) NC(6.6,-0.6) NC(6.6,-0.2) NC(6.6,0.2) NC(6.6,0.6) NC(6.6,1) NC(6.6,1.4) NC(6.6,1.8) NC(6.6,2.2) NC(6.6,2.6) NC(6.6,3) NC(6.6,3.4) NC(6.6,3.8) NC(6.6,6.6)
Top Overlay:
  circle w0.25: c-7.195,7.195 r0.125
Top Assembly:
  lines w0.051: -7,-7 7,-7 7,7 -7,7 -7,-7
  text ".Designator" at -2.362,0.068 h0.51
Top Courtyard:
  lines w0.1: -0.5,0 0.5,0 ; 0,-0.5 0,0.5
  lines w0.127: -7.25,-7.25 7.25,-7.25 7.25,7.25 -7.25,7.25 -7.25,-7.25
3D body "IC_DRAM_BGA376C40P34X34_1400X1400X71.step": height 0.71, standoff 0, extent -7,-7 7,7

## IC_DRAM_MT53E1536M32D4DT-046 WT:A [mil] "BGA200_0P65X0P8_10P1X14P6"
pads (200):
  round 11.5 smd: A1(-173.23,268.7) A2(-141.73,268.7) A3(-110.24,268.7) A4(-78.74,268.7) A5(-47.24,268.7) A8(47.24,268.7) A9(78.74,268.7) A10(110.24,268.7) A11(141.73,268.7) A12(173.23,268.7) AA1(-173.23,-243.11) AA2(-141.73,-243.11) AA3(-110.24,-243.11) AA4(-78.74,-243.11) AA5(-47.24,-243.11) AA8(47.24,-243.11) AA9(78.74,-243.11) AA10(110.24,-243.11) AA11(141.73,-243.11) AA12(173.23,-243.11) AB1(-173.23,-268.7) AB2(-141.73,-268.7) AB3(-110.24,-268.7) AB4(-78.74,-268.7) AB5(-47.24,-268.7) AB8(47.24,-268.7) AB9(78.74,-268.7) AB10(110.24,-268.7) AB11(141.73,-268.7) AB12(173.23,-268.7) B1(-173.23,243.11) B2(-141.73,243.11) B3(-110.24,243.11) B4(-78.74,243.11) B5(-47.24,243.11) B8(47.24,243.11) B9(78.74,243.11) B10(110.24,243.11) B11(141.73,243.11) B12(173.23,243.11) C1(-173.23,217.52) C2(-141.73,217.52) C3(-110.24,217.52) C4(-78.74,217.52) C5(-47.24,217.52) C8(47.24,217.52) C9(78.74,217.52) C10(110.24,217.52) C11(141.73,217.52) C12(173.23,217.52) D1(-173.23,191.93) D2(-141.73,191.93) D3(-110.24,191.93) D4(-78.74,191.93) D5(-47.24,191.93) D8(47.24,191.93) D9(78.74,191.93) D10(110.24,191.93) D11(141.73,191.93) D12(173.23,191.93) E1(-173.23,166.34) E2(-141.73,166.34) E3(-110.24,166.34) E4(-78.74,166.34) E5(-47.24,166.34) E8(47.24,166.34) E9(78.74,166.34) E10(110.24,166.34) E11(141.73,166.34) E12(173.23,166.34) F1(-173.23,140.75) F2(-141.73,140.75) F3(-110.24,140.75) F4(-78.74,140.75) F5(-47.24,140.75) F8(47.24,140.75) F9(78.74,140.75) F10(110.24,140.75) F11(141.73,140.75) F12(173.23,140.75) G1(-173.23,115.16) G2(-141.73,115.16) G3(-110.24,115.16) G4(-78.74,115.16) G5(-47.24,115.16) G8(47.24,115.16) G9(78.74,115.16) G10(110.24,115.16) G11(141.73,115.16) G12(173.23,115.16) H1(-173.23,89.57) H2(-141.73,89.57) H3(-110.24,89.57) H4(-78.74,89.57) H5(-47.24,89.57) H8(47.24,89.57) H9(78.74,89.57) H10(110.24,89.57) H11(141.73,89.57) H12(173.23,89.57) J1(-173.23,63.98) J2(-141.73,63.98) J3(-110.24,63.98) J4(-78.74,63.98) J5(-47.24,63.98) J8(47.24,63.98) J9(78.74,63.98) J10(110.24,63.98) J11(141.73,63.98) J12(173.23,63.98) K1(-173.23,38.39) K2(-141.73,38.39) K3(-110.24,38.39) K4(-78.74,38.39) K5(-47.24,38.39) K8(47.24,38.39) K9(78.74,38.39) K10(110.24,38.39) K11(141.73,38.39) K12(173.23,38.39) N1(-173.23,-38.39) N2(-141.73,-38.39) N3(-110.24,-38.39) N4(-78.74,-38.39) N5(-47.24,-38.39) N8(47.24,-38.39) N9(78.74,-38.39) N10(110.24,-38.39) N11(141.73,-38.39) N12(173.23,-38.39) P1(-173.23,-63.98) P2(-141.73,-63.98) P3(-110.24,-63.98) P4(-78.74,-63.98) P5(-47.24,-63.98) P8(47.24,-63.98) P9(78.74,-63.98) P10(110.24,-63.98) P11(141.73,-63.98) P12(173.23,-63.98) R1(-173.23,-89.57) R2(-141.73,-89.57) R3(-110.24,-89.57) R4(-78.74,-89.57) R5(-47.24,-89.57) R8(47.24,-89.57) R9(78.74,-89.57) R10(110.24,-89.57) R11(141.73,-89.57) R12(173.23,-89.57) T1(-173.23,-115.16) T2(-141.73,-115.16) T3(-110.24,-115.16) T4(-78.74,-115.16) T5(-47.24,-115.16) T8(47.24,-115.16) T9(78.74,-115.16) T10(110.24,-115.16) T11(141.73,-115.16) T12(173.23,-115.16) U1(-173.23,-140.75) U2(-141.73,-140.75) U3(-110.24,-140.75) U4(-78.74,-140.75) U5(-47.24,-140.75) U8(47.24,-140.75) U9(78.74,-140.75) U10(110.24,-140.75) U11(141.73,-140.75) U12(173.23,-140.75) V1(-173.23,-166.34) V2(-141.73,-166.34) V3(-110.24,-166.34) V4(-78.74,-166.34) V5(-47.24,-166.34) V8(47.24,-166.34) V9(78.74,-166.34) V10(110.24,-166.34) V11(141.73,-166.34) V12(173.23,-166.34) W1(-173.23,-191.93) W2(-141.73,-191.93) W3(-110.24,-191.93) W4(-78.74,-191.93) W5(-47.24,-191.93) W8(47.24,-191.93) W9(78.74,-191.93) W10(110.24,-191.93) W11(141.73,-191.93) W12(173.23,-191.93) Y1(-173.23,-217.52) Y2(-141.73,-217.52) Y3(-110.24,-217.52) Y4(-78.74,-217.52) Y5(-47.24,-217.52) Y8(47.24,-217.52) Y9(78.74,-217.52) Y10(110.24,-217.52) Y11(141.73,-217.52) Y12(173.23,-217.52)
Top Overlay:
  lines w5: -244.09,-212.6 -220.47,-212.6 ; -244.09,-86.61 -220.47,-86.61 ; -244.09,39.37 -220.47,39.37 ; -244.09,165.35 -220.47,165.35 ; -47.24,307.09 -47.24,330.71 ; 110.24,307.09 110.24,330.71 ; -205.82,-294.4 205.82,-294.4 205.82,294.4 -180.82,294.4 -205.82,269.4 -205.82,-294.4
  text "12" at 224.76,339.97 h31
  text "AB" at -218.24,-226.03 h31
  text "A" at -218.24,287.97 h31
  text "1" at -171,334 h31
Top Assembly:
  lines w5: -213,-302 213,-302 213,301 -213,301 -213,-302
  text ".Designator" at -102,-6.34 h20
Top Courtyard:
  lines w5: -26,0 0,0 ; 0,-26 0,0 ; 0,26 0,0 ; 26,0 0,0 ; -213,-302 213,-302 213,301 -213,301 -213,-302
3D body "VFBGA200_10X14_5_DT_MRN.step": height 37.09, standoff -0.01, extent -199.02,-287.48 199.02,287.48

## IC_DRIVER_SOP127P600X175-16N [mm] "SOP, 16-Leads, Body 10.00x3.90mm, Pitch 1.27mm, IPC Medium Density"
height 1.75
pads (16):
  rrect20% 1.45x0.6 smd: 1(-2.725,4.445) 2(-2.725,3.175) 3(-2.725,1.905) 4(-2.725,0.635) 5(-2.725,-0.635) 6(-2.725,-1.905) 7(-2.725,-3.175) 8(-2.725,-4.445) 9(2.725,-4.445) 10(2.725,-3.175) 11(2.725,-1.905) 12(2.725,-0.635) 13(2.725,0.635) 14(2.725,1.905) 15(2.725,3.175) 16(2.725,4.445)
Top Overlay:
  lines w0.127: -3.5,5.1 -1.6,5.1 ; -1.6,5.1 -1.6,-5.1 1.6,-5.1 1.6,5.1 -1.6,5.1
Top Assembly:
  circle w0.051: c-1.125,4.225 r0.5
  lines w0.051: -2,-5.1 -2,5.1 2,5.1 2,-5.1 -2,-5.1
  text ".Designator" at -2.489,-0.034 h0.51
Top Courtyard:
  lines w0.127: -0.889,0 0,0 ; 0,-0.889 0,0 ; 0,0.889 0,0 ; 0.889,0 0,0 ; -3.7,-5.35 -3.7,5.35 3.7,5.35 3.7,-5.35 -3.7,-5.35
3D body "SOP127P600X175-16N.step": height 1.75, standoff 0, extent -3,-5.1 3,5.1

## IC_ESP32-C6-MINI-1-N4 [mm]
height 2.55
pads (61):
  rrect20% 0.8x0.4 smd: 1(-5.9,4) 2(-5.9,3.2) 3(-5.9,2.4) 4(-5.9,1.6) 5(-5.9,0.8) 6(-5.9,0) 7(-5.9,-0.8) 8(-5.9,-1.6) 9(-5.9,-2.4) 10(-5.9,-3.2) 11(-5.9,-4) 25(5.9,-4) 26(5.9,-3.2) 27(5.9,-2.4) 28(5.9,-1.6) 29(5.9,-0.8) 30(5.9,0) 31(5.9,0.8) 32(5.9,1.6) 33(5.9,2.4) 34(5.9,3.2) 35(5.9,4)
  rrect20% 0.4x0.8 smd: 12(-4.8,-4.9) 13(-4,-4.9) 14(-3.2,-4.9) 15(-2.4,-4.9) 16(-1.6,-4.9) 17(-0.8,-4.9) 18(0,-4.9) 19(0.8,-4.9) 20(1.6,-4.9) 21(2.4,-4.9) 22(3.2,-4.9) 23(4,-4.9) 24(4.8,-4.9) 36(4.8,4.9) 37(4,4.9) 38(3.2,4.9) 39(2.4,4.9) 40(1.6,4.9) 41(0.8,4.9) 42(0,4.9) 43(-0.8,4.9) 44(-1.6,4.9) 45(-2.4,4.9) 46(-3.2,4.9) 47(-4,4.9) 48(-4.8,4.9)
  rect 0.4x0.4 smd paste-1 mask+0: 49_1(-1.975,1.975)
  rect 1.45x1.45 smd: 49_2(0,1.975) 49_3(1.975,1.975) 49_4(-1.975,0) 49_5(0,0) 49_6(1.975,0) 49_7(-1.975,-1.975) 49_8(0,-1.975) 49_9(1.975,-1.975)
  rrect20% 0.7x0.7 smd: 50(5.95,4.95) 51(5.95,-4.95) 52(-5.95,-4.95) 53(-5.95,4.95)
Top Layer:
  region: -1.25,1.25 -2.7,1.25 -2.7,2.1 -2.1,2.7 -1.25,2.7
Top Overlay:
  lines w0.127: -6.833,3.632 -6.833,4.445 ; -6.6,5.62 -6.6,11 6.6,11 6.6,5.62
Top Paste:
  region: -1.25,1.25 -2.7,1.25 -2.7,2.1 -2.1,2.7 -1.25,2.7
Top Solder:
  region: -1.15,1.15 -2.8,1.15 -2.8,2.15 -2.15,2.8 -1.15,2.8
Top Assembly:
  lines w0.051: -6.6,-5.6 -6.6,11 6.6,11 6.6,-5.6 -6.6,-5.6
  text ".Designator" at -2.54,-0.11 h0.51
Top Courtyard:
  lines w0.127: -1,0 0,0 ; 0,-1 0,0 ; 0,1 0,0 ; 1,0 0,0 ; -6.85,-5.85 -6.85,11.25 6.85,11.25 6.85,-5.85 -6.85,-5.85
3D body "step_temp.STEP": height 2.55, standoff 0, extent -6.6,-5.588 6.6,11.012

## IC_ESP32-S3 [mm] "56-QFN (7x7)"
height 0.9
pads (69):
  rrect20% 0.65x0.22 smd mask+0.05: 1(-3.425,2.6) 2(-3.425,2.2) 3(-3.425,1.8) 4(-3.425,1.4) 5(-3.425,1) 6(-3.425,0.6) 7(-3.425,0.2) 8(-3.425,-0.2) 9(-3.425,-0.6) 10(-3.425,-1) 11(-3.425,-1.4) 12(-3.425,-1.8) 13(-3.425,-2.2) 14(-3.425,-2.6) 29(3.425,-2.6) 30(3.425,-2.2) 31(3.425,-1.8) 32(3.425,-1.4) 33(3.425,-1) 34(3.425,-0.6) 35(3.425,-0.2) 36(3.425,0.2) 37(3.425,0.6) 38(3.425,1) 39(3.425,1.4) 40(3.425,1.8) 41(3.425,2.2) 42(3.425,2.6)
  rrect20% 0.22x0.65 smd mask+0.05: 15(-2.6,-3.425) 16(-2.2,-3.425) 17(-1.8,-3.425) 18(-1.4,-3.425) 19(-1,-3.425) 20(-0.6,-3.425) 21(-0.2,-3.425) 22(0.2,-3.425) 23(0.6,-3.425) 24(1,-3.425) 25(1.4,-3.425) 26(1.8,-3.425) 27(2.2,-3.425) 28(2.6,-3.425) 43(2.6,3.425) 44(2.2,3.425) 45(1.8,3.425) 46(1.4,3.425) 47(1,3.425) 48(0.6,3.425) 49(0.2,3.425) 50(-0.2,3.425) 51(-0.6,3.425) 52(-1,3.425) 53(-1.4,3.425) 54(-1.8,3.425) 55(-2.2,3.425) 56(-2.6,3.425)
  rect 4.1x4.1 smd paste-1.55: 57(0,0)
  round 0.5 hole 0.4 mask+0: 58(-0.75,1.5) 59(0.75,1.5) 60(-1.5,0.75) 61(0,0.75) 62(1.5,0.75) 63(-0.75,0) 64(0.75,0) 65(-1.5,-0.75) 66(0,-0.75) 67(1.5,-0.75) 68(-0.75,-1.5) 69(0.75,-1.5)
Top Overlay:
  lines w0.127: -3.5,-3.03 -3.5,-3.5 -3.03,-3.5 ; 3.03,-3.5 3.5,-3.5 3.5,-3.03 ; 3.03,3.5 3.5,3.5 3.5,3.03 ; -3.708,3.238 -3.5,3.03 -3.5,3.5 -3.03,3.5 -3.238,3.708 -3.708,3.708 -3.708,3.238
Top Paste:
  region: -1,1 -2,1 -2,2 -1,2
  region: -1,-0.5 -2,-0.5 -2,0.5 -1,0.5
  region: -1,-2 -2,-2 -2,-1 -1,-1
  region: 0.5,-2 -0.5,-2 -0.5,-1 0.5,-1
  region: 2,-2 1,-2 1,-1 2,-1
  region: 2,-0.5 1,-0.5 1,0.5 2,0.5
  region: 2,1 1,1 1,2 2,2
  region: 0.5,1 -0.5,1 -0.5,2 0.5,2
Top Assembly:
  lines w0.051: -3.5,-3.5 3.5,-3.5 3.5,3.5 -3.5,3.5 -3.5,-3.5
  text ".Designator" at -2.591,-0.11 h0.51
Top Courtyard:
  lines w0.127: -0.711,0 0,0 ; 0,-0.711 0,0 ; 0,0.711 0,0 ; 0.711,0 0,0 ; -4.1,-4.1 -4.1,4.1 4.1,4.1 4.1,-4.1 -4.1,-4.1
3D body "step_temp.STEP": height 0.9, standoff 0, extent -3.5,-3.5 3.5,3.5

## IC_FLASH_SOIC127P790X216-8N [mm]
pads (8):
  rrect20% 1.65x0.65 smd: 1(-3.6,1.905) 2(-3.6,0.635) 3(-3.6,-0.635) 4(-3.6,-1.905) 5(3.6,-1.905) 6(3.6,-0.635) 7(3.6,0.635) 8(3.6,1.905)
Top Overlay:
  lines w0.127: -4.425,2.58 -2.775,2.58 ; -2.425,-2.64 2.425,-2.64 2.425,2.64 -2.425,2.64 -2.425,-2.64
Top Assembly:
  lines w0.051: -2.64,1.37 -1.37,2.64 ; -2.64,-2.64 2.64,-2.64 2.64,2.64 -2.64,2.64 -2.64,-2.64
  text ".Designator" at -2.649,-0.18 h0.51
Top Courtyard:
  lines w0.127: -1.4,0 0,0 ; 0,-1.4 0,0 ; 0,1.4 0,0 ; 1.4,0 0,0 ; -4.675,-2.94 4.675,-2.94 4.675,2.94 -4.675,2.94 -4.675,-2.94
3D body "W25Q32JVSSIQ.stp": height 2.16, standoff 0, extent -3.95,-2.64 3.95,2.64

## IC_FLASH_SOIC127P798X216-8N [mm] "8-SOIC"
height 0.6
pads (8):
  rrect20% 1.75x0.65 smd: 1(-3.625,1.905) 2(-3.625,0.635) 3(-3.625,-0.635) 4(-3.625,-1.905) 5(3.625,-1.905) 6(3.625,-0.635) 7(3.625,0.635) 8(3.625,1.905)
Top Overlay:
  lines w0.127: -4.5,2.58 -2.75,2.58 ; -2.4,-2.62 -2.4,2.62 2.4,2.62 2.4,-2.62 -2.4,-2.62
Top Assembly:
  lines w0.051: -2.645,1.35 -1.375,2.62 ; -2.645,-2.62 -2.645,2.62 2.645,2.62 2.645,-2.62 -2.645,-2.62
  text ".Designator" at -2.718,-0.136 h0.51
Top Courtyard:
  lines w0.127: -0.813,0 0,0 ; 0,-0.813 0,0 ; 0,0.813 0,0 ; 0.813,0 0,0 ; -4.75,-2.925 -4.75,2.925 4.75,2.925 4.75,-2.925 -4.75,-2.925
3D body "AT25DF321A-SH-B.stp": height 2.16, standoff 0, extent -3.99,-2.62 3.99,2.62